# Altium footprint library C210 Rev_D_221221a.PcbLib: 89 footprints (part 6 of 6)
Each footprint in its own frame and in the unit in brackets; x right, y up, seen from the top. Pads: shape width x height; smd on the part's side, far side on the other; paste and mask are expansions set on the pad; w line width, h text height; cw(c..) or ccw(c..) is an arc to the next point about the centre after c.
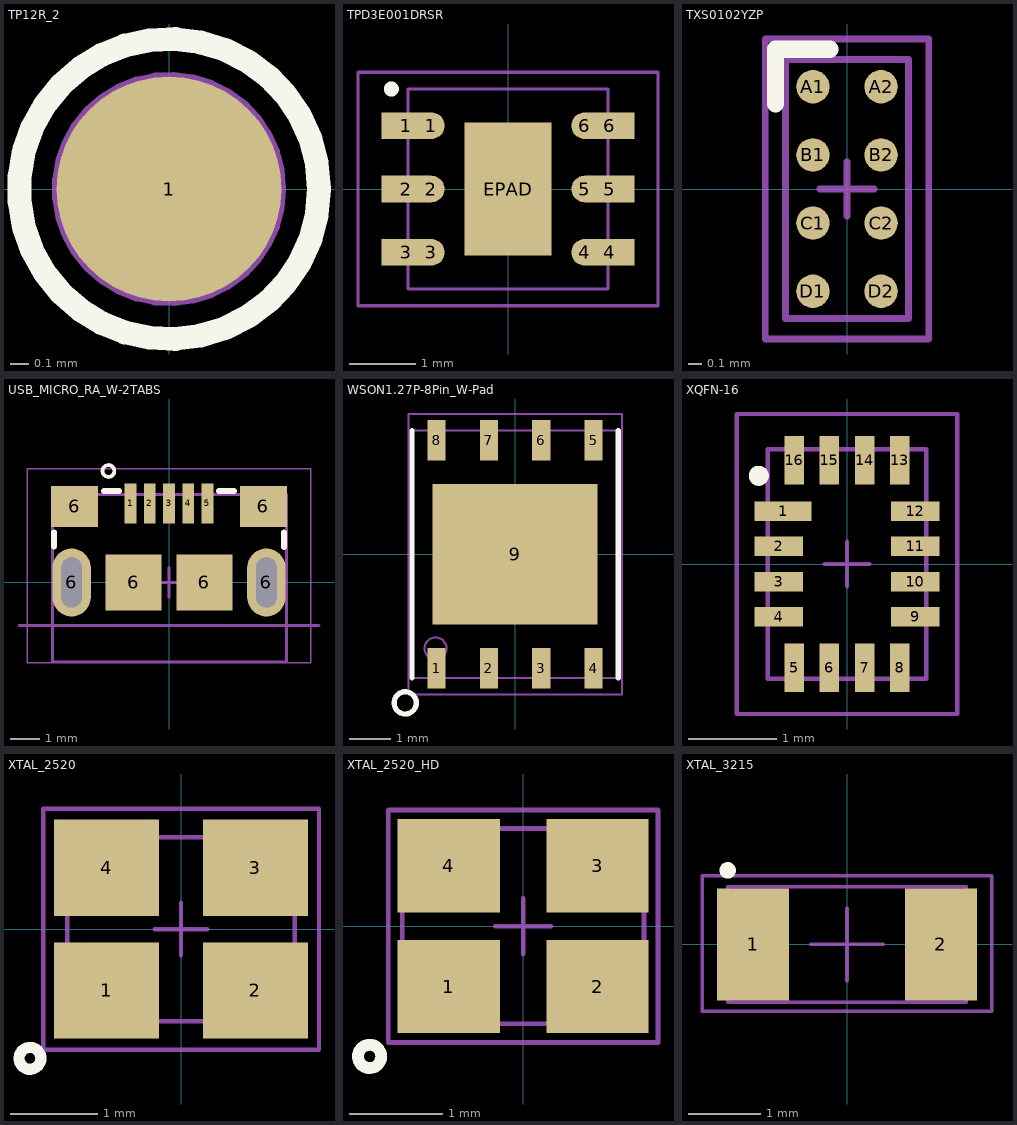
[diagram p5: the footprints below, top view; thin cyan lines are the x and y axes]

## TP12R_2 [mm]
pads (1):
  round 1.2 smd paste-10: 1(0,0)
Top Overlay:
  circle w0.127: c0,0 r0.8
Mechanical 11:
  text ".Designator" at 0.22,-0.575 h0.5
Mechanical 13:
  circle w0.05: c0,0 r0.6
3D body: height 0.05, standoff 0, extent -0.6,-0.6 0.6,0.6

## TPD3E001DRSR [mm]
pads (13):
  rect 0.75x0.4 smd paste-0.025 mask+0.07: 1(-1.525,0.95) 2(-1.525,0) 3(-1.525,-0.95) 4(1.525,-0.95) 5(1.525,0) 6(1.525,0.95)
  round 0.4 smd paste-0.025 mask+0.07: 1(-1.15,0.95) 2(-1.15,0) 3(-1.15,-0.95) 4(1.15,-0.95) 5(1.15,0) 6(1.15,0.95)
  rect 1.3x2 smd paste-0.15 mask+0.05: EPAD(0,0)
Top Overlay:
  circle w0.127: c-1.75,1.5 r0.05
Mechanical 11:
  text ".Designator" at -1.27,0 h0.5
Mechanical 13:
  circle w0.05: c-1.15,0.95 r0.16
  lines w0.05: -1.5,-1.5 1.5,-1.5 1.5,1.5 -1.5,1.5 -1.5,-1.5
Mechanical 15:
  lines w0.05: -0.25,0 0.25,0 ; 0,-0.25 0,0.25 ; 0,-0.1 0,0.1 ; -2.25,-1.75 2.25,-1.75 2.25,1.75 -2.25,1.75 -2.25,-1.75
3D body "User Library-WSON-6.step": height 0.76, standoff 0.01, extent -1.51,-1.5 1.51,1.5

## TXS0102YZP [mm]
pads (8):
  round 0.245 smd paste-10 mask+0.05: A1(-0.25,0.75) A2(0.25,0.75) B1(-0.25,0.25) B2(0.25,0.25) C1(-0.25,-0.25) C2(0.25,-0.25) D1(-0.25,-0.75) D2(0.25,-0.75)
Top Overlay:
  lines w0.127: -0.525,0.625 -0.525,1.025 -0.125,1.025
Top Paste:
  drawing of 8 lines, arcs and shapes, not listed
Mechanical 11:
  text ".Designator" at -0.5,-0.1 h0.25
Mechanical 13:
  circle w0.1: c-0.25,0.75 r0.025
  lines w0.05: -0.45,-0.95 -0.45,0.95 0.45,0.95 0.45,-0.95 -0.45,-0.95
Mechanical 15:
  lines w0.05: -0.2,0 0.2,0 ; 0,-0.2 0,0.2 ; -0.6,-1.1 0.6,-1.1 0.6,1.1 -0.6,1.1 -0.6,-1.1
3D body: height 0.25, standoff -0.05, extent -0.391,-0.898 -0.1,-0.602
3D body: height 0.25, standoff -0.05, extent 0.109,-0.898 0.4,-0.602
3D body: height 0.63, standoff 0.63, extent -0.4,0.7 -0.2,0.9
3D body: height 0.25, standoff -0.05, extent -0.391,0.102 -0.1,0.398
3D body: height 0.25, standoff -0.05, extent -0.391,0.602 -0.1,0.898
3D body: height 0.25, standoff -0.05, extent 0.109,0.602 0.4,0.898
3D body: height 0.25, standoff -0.05, extent 0.109,0.102 0.4,0.398
3D body: height 0.25, standoff -0.05, extent -0.391,-0.398 -0.1,-0.102
3D body: height 0.25, standoff -0.05, extent 0.109,-0.398 0.4,-0.102
3D body: height 0.63, standoff 0.2, extent -0.45,-0.95 0.45,0.95

## USB_MICRO_RA_W-2TABS [mm]
pads (11):
  rect 0.4x1.35 smd: 1(-1.3,2.675) 2(-0.65,2.675) 3(0,2.675) 4(0.65,2.675) 5(1.3,2.675)
  oval 1.3x2.3 hole 0.7 slot 1.7 at 90 deg: 6(-3.3,0) 6(3.3,0.001)
  rect 1.6x1.4 smd: 6(-3.2,2.575) 6(3.2,2.575)
  rect 1.9x1.9 smd: 6(-1.2,0) 6(1.2,0)
Top Overlay:
  circle w0.127: c-2.05,3.775 r0.2
  lines w0.2: -3.9,1.225 -3.9,1.7 ; -2.2,3.1 -1.7,3.1 ; 1.7,3.1 2.2,3.1 ; 3.9,1.2 3.9,1.7
Mechanical 11:
  text ".Designator" at -0.575,1.155 h0.5
Mechanical 13:
  lines w0.1: -3.95,-2.7 3.975,-2.7 3.975,2.976 -3.95,2.976 -3.95,-2.7
Mechanical 15:
  lines w0.05: -4.8,3.851 4.8,3.851 4.8,-2.723 -4.8,-2.723 -4.8,3.851
  lines w0.1: -5.08,-1.45 5.08,-1.45 ; -0.5,0 0.5,0 ; 0,-0.5 0,0.5
3D body "10118193-0001lfc.stp": height 2.87, standoff -0.73, extent -3.903,-2.711 3.953,2.95

## WSON1.27P-8Pin_W-Pad [mm]
pads (9):
  rect 0.44x0.98 smd: 1(-1.905,-2.765) 2(-0.635,-2.765) 3(0.635,-2.765) 4(1.905,-2.765) 5(1.905,2.765) 6(0.635,2.765) 7(-0.635,2.765) 8(-1.905,2.765)
  rect 4x3.4 smd paste-4 mask+0: 9(0,0)
Top Overlay:
  circle w0.127: c-2.667,-3.607 r0.27
  lines w0.127: -2.5,-3 -2.5,3 ; 2.5,-3 2.5,3
Top Paste:
  region: -0.18,0.18 -1.64,0.18 -1.64,1.34 -0.18,1.34
  region: -0.18,-1.34 -1.64,-1.34 -1.64,-0.18 -0.18,-0.18
  region: 1.64,0.18 0.18,0.18 0.18,1.34 1.64,1.34
  region: 1.64,-1.34 0.18,-1.34 0.18,-0.18 1.64,-0.18
Mechanical 11:
  text ".Designator" at -0.838,-0.229 h0.5
Mechanical 13:
  circle w0.05: c-1.93,-2.286 r0.265
  lines w0.05: -2.5,-3 2.5,-3 2.5,3 -2.5,3 -2.5,-3
Mechanical 15:
  lines w0.05: -0.35,0 0.35,0 ; 0,-0.35 0,0.35 ; -2.591,-3.404 2.591,-3.404 2.591,3.404 -2.591,3.404 -2.591,-3.404
3D body "SON9P127_500X600X80L62X41T400X340.STEP": height 0.8, standoff 0, extent -2.5,-3.05 2.5,3.05

## XQFN-16 [mm]
pads (16):
  rect 0.65x0.22 smd mask+0.05: 1(-0.725,0.6)
  rect 0.55x0.22 smd mask+0.05: 2(-0.775,0.2) 3(-0.775,-0.2) 4(-0.775,-0.6) 9(0.775,-0.6) 10(0.775,-0.2) 11(0.775,0.2) 12(0.775,0.6)
  rect 0.22x0.55 smd mask+0.05: 5(-0.6,-1.175) 6(-0.2,-1.175) 7(0.2,-1.175) 8(0.6,-1.175) 13(0.6,1.175) 14(0.2,1.175) 15(-0.2,1.175) 16(-0.6,1.175)
Top Overlay:
  circle w0.127: c-1,1 r0.05
Mechanical 11:
  text ".Designator" at -0.635,0 h0.5
Mechanical 13:
  circle w0.05: c-0.71,0.6 r0.01
  lines w0.05: -0.9,-1.3 -0.9,1.3 0.9,1.3 0.9,-1.3 -0.9,-1.3
Mechanical 15:
  lines w0.05: -0.25,0 0.25,0 ; 0,-0.25 0,0.25 ; 0,-0.1 0,0.1 ; -1.25,-1.7 -1.25,1.7 1.25,1.7 1.25,-1.7 -1.25,-1.7
3D body "User Library-XQFN-16-1.step": height 0.56, standoff 0.01, extent -0.91,-1.31 0.91,1.31

## XTAL_2520 [mm]
pads (4):
  rect 1.2x1.1 smd: 1(-0.85,-0.7) 2(0.85,-0.7) 3(0.85,0.7) 4(-0.85,0.7)
Top Overlay:
  circle w0.127: c-1.725,-1.475 r0.125
Mechanical 11:
  text ".Designator" at -0.6,-0.25 h0.5
Mechanical 13:
  lines w0.05: -1.3,-1.05 -1.3,1.05 1.3,1.05 1.3,-1.05 -1.3,-1.05
Mechanical 15:
  lines w0.05: -0.3,0 0.3,0 ; 0,-0.3 0,0.3 ; -1.575,-1.375 -1.575,1.375 1.575,1.375 1.575,-1.375 -1.575,-1.375
3D body "XTAL_2520.STEP": height 0.8, standoff 0, extent -1.25,-1 1.25,1

## XTAL_2520_HD [mm]
pads (4):
  rect 1.1x1 smd: 1(-0.8,-0.65) 2(0.8,-0.65) 3(0.8,0.65) 4(-0.8,0.65)
Top Overlay:
  circle w0.127: c-1.65,-1.4 r0.125
Mechanical 11:
  text ".Designator" at -0.6,-0.25 h0.5
Mechanical 13:
  lines w0.05: -1.3,-1.05 1.3,-1.05 1.3,1.05 -1.3,1.05 -1.3,-1.05
Mechanical 15:
  lines w0.05: -0.3,0 0.3,0 ; 0,-0.3 0,0.3 ; -1.45,-1.25 1.45,-1.25 1.45,1.25 -1.45,1.25 -1.45,-1.25
3D body: height 0.55, standoff 0, extent -1.3,-1.05 1.3,1.05

## XTAL_3215 [mm]
pads (2):
  rect 1x1.55 smd: 1(-1.3,0) 2(1.3,0)
Top Overlay:
  circle w0.127: c-1.65,1.025 r0.05
Mechanical 11:
  text ".Designator" at -0.275,0.325 h0.5
Mechanical 13:
  lines w0.05: -1.65,-0.8 -1.65,0.8 1.65,0.8 1.65,-0.8 -1.65,-0.8
Mechanical 15:
  lines w0.05: -0.5,0 0.5,0 ; 0,-0.5 0,0.5 ; -2,-0.925 -2,0.95 2,0.95 2,-0.925 -2,-0.925
3D body: height 0.9, standoff 0, extent -1.65,-0.8 1.65,0.8